# Altium schematic symbol library Capacitor - Ceramic - Sumsung.SchLib: 1421 symbols (part 7 of 8) (continued)
## CL31C101JHFNFNE (continued)
CAP CER 100PF 630V NP0 1206; Part Number: CL31C101JHFNFNE; Manufacturer: Samsung Electro-Mechanics America, Inc.; TemperatureRange: -55C ~ 125C; TemperatureCoefficient: C0G, NP0; Tolerance: 5%; Value: 100pF; PartId: 15492; Supplier 1: Digi-Key; Supplier Part Number 1: 1276-3197-2-ND; ComponentLink1Description: Datasheet; ComponentLink1URL: http://www.samsungsem.com/kr/support/product-search/mlcc/CL31C101JHFNFNE.jsp; ComponentLink2Description: Digi-Key Listing; ComponentLink2URL: https://www.digikey.com/product-detail/en/samsung-electro-mechanics-america-inc/CL31C101JHFNFNE/1276-3197-2-ND/3888855; Voltage: 630V; Price: 0.044; Device Package: 1206 (3216 Metric)
footprint CAP 1206/3216
pins: 1, 2

## CL31C101JHFNNNE
designator C?, comment 100pF
CAP CER 100PF 630V NP0 1206; Part Number: CL31C101JHFNNNE; Manufacturer: Samsung Electro-Mechanics America, Inc.; TemperatureRange: -55C ~ 125C; TemperatureCoefficient: C0G, NP0; Tolerance: 5%; Value: 100pF; PartId: 15476; Supplier 1: Digi-Key; Supplier Part Number 1: 1276-3198-2-ND; ComponentLink1Description: Datasheet; ComponentLink1URL: http://www.samsungsem.com/kr/support/product-search/mlcc/CL31C101JHFNNNE.jsp; ComponentLink2Description: Digi-Key Listing; ComponentLink2URL: https://www.digikey.com/product-detail/en/samsung-electro-mechanics-america-inc/CL31C101JHFNNNE/1276-3198-2-ND/3888856; Voltage: 630V; Price: 0.044; Device Package: 1206 (3216 Metric)
footprint CAP 1206/3216
pins: 1, 2

## CL31C101JIFNNNE
designator C?, comment 100pF
CAP CER 100PF 1KV NP0 1206; Part Number: CL31C101JIFNNNE; Manufacturer: Samsung Electro-Mechanics America, Inc.; TemperatureRange: -55C ~ 125C; TemperatureCoefficient: C0G, NP0; Tolerance: 5%; Voltage: 1000V (1kV); Value: 100pF; PartId: 15447; Supplier 1: Digi-Key; Supplier Part Number 1: 1276-3200-2-ND; ComponentLink1Description: Datasheet; ComponentLink1URL: http://www.samsungsem.com/kr/support/product-search/mlcc/CL31C101JIFNNNE.jsp; ComponentLink2Description: Digi-Key Listing; ComponentLink2URL: https://www.digikey.com/product-detail/en/samsung-electro-mechanics-america-inc/CL31C101JIFNNNE/1276-3200-2-ND/3888858; Price: 0.0547; Device Package: 1206 (3216 Metric)
footprint CAP 1206/3216
pins: 1, 2

## CL31C101JJHNNNE
designator C?, comment 100pF
CAP CER 100PF 2KV NP0 1206; Part Number: CL31C101JJHNNNE; Manufacturer: Samsung Electro-Mechanics America, Inc.; TemperatureRange: -55C ~ 125C; TemperatureCoefficient: C0G, NP0; Tolerance: 5%; Voltage: 2000V (2kV); Value: 100pF; PartId: 15471; Supplier 1: Digi-Key; Supplier Part Number 1: 1276-3201-2-ND; ComponentLink1Description: Datasheet; ComponentLink1URL: http://www.samsungsem.com/kr/support/product-search/mlcc/CL31C101JJHNNNE.jsp; ComponentLink2Description: Digi-Key Listing; ComponentLink2URL: https://www.digikey.com/product-detail/en/samsung-electro-mechanics-america-inc/CL31C101JJHNNNE/1276-3201-2-ND/3888859; Price: 0.0874; Device Package: 1206 (3216 Metric)
footprint CAP 1206/3216
pins: 1, 2

## CL31C101KBCNNNC
designator C?, comment 100pF
CAP CER 100PF 50V NP0 1206; Part Number: CL31C101KBCNNNC; Manufacturer: Samsung Electro-Mechanics America, Inc.; TemperatureRange: -55C ~ 125C; TemperatureCoefficient: C0G, NP0; Tolerance: 10%; Value: 100pF; PartId: 17304; Supplier 1: Digi-Key; Supplier Part Number 1: 1276-2802-2-ND; ComponentLink1Description: Datasheet; ComponentLink1URL: http://www.samsungsem.com/kr/support/product-search/mlcc/__icsFiles/afieldfile/2016/08/18/S_CL31C101KBCNNNC.pdf; ComponentLink2Description: Digi-Key Listing; ComponentLink2URL: https://www.digikey.com/product-detail/en/samsung-electro-mechanics-america-inc/CL31C101KBCNNNC/1276-2802-2-ND/3888460; Voltage: 50V; Price: 0.0339; Device Package: 1206 (3216 Metric)
footprint CAP 1206/3216 - 1.0MM
pins: 1, 2

## CL31C101KGFNNNE
designator C?, comment 100pF
CAP CER 100PF 500V NP0 1206; Part Number: CL31C101KGFNNNE; Manufacturer: Samsung Electro-Mechanics America, Inc.; TemperatureRange: -55C ~ 125C; TemperatureCoefficient: C0G, NP0; Tolerance: 10%; Value: 100pF; PartId: 15432; Supplier 1: Digi-Key; Supplier Part Number 1: 1276-3202-2-ND; ComponentLink1Description: Datasheet; ComponentLink1URL: http://www.samsungsem.com/kr/support/product-search/mlcc/CL31C101KGFNNNE.jsp; ComponentLink2Description: Digi-Key Listing; ComponentLink2URL: https://www.digikey.com/product-detail/en/samsung-electro-mechanics-america-inc/CL31C101KGFNNNE/1276-3202-2-ND/3888860; Voltage: 500V; Price: 0.044; Device Package: 1206 (3216 Metric)
footprint CAP 1206/3216
pins: 1, 2

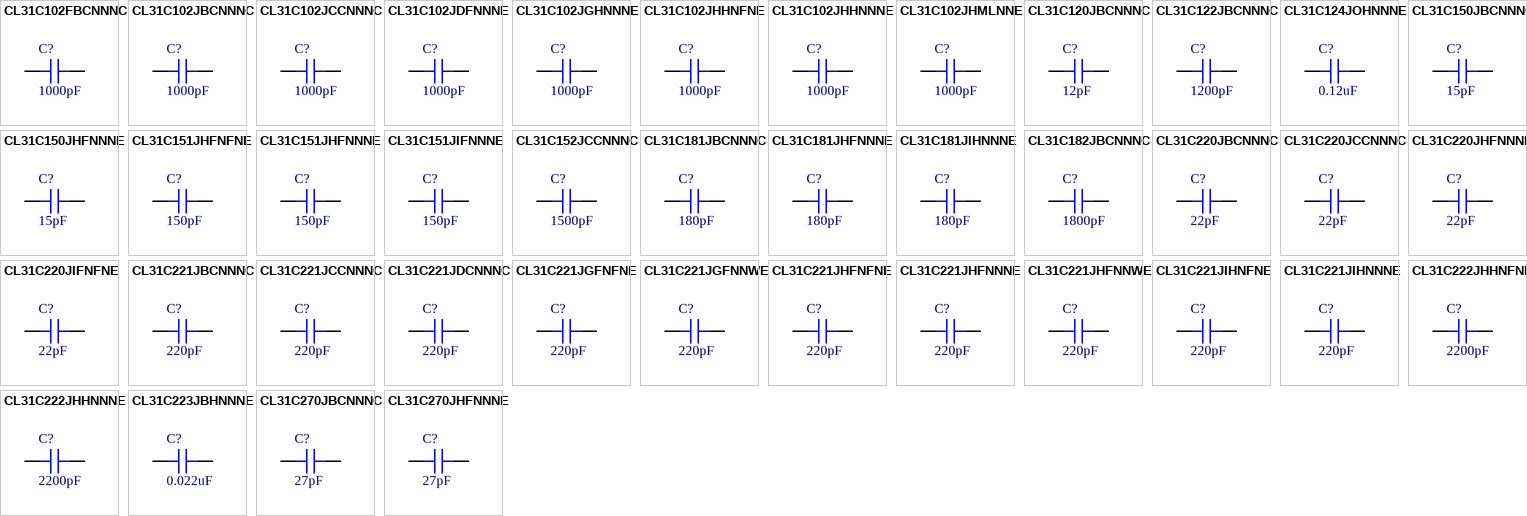
[diagram p30: symbols CL31C102FBCNNNC to CL31C270JHFNNNE]

## CL31C102FBCNNNC
designator C?, comment 1000pF
CAP CER 1000PF 50V NP0 1206; Part Number: CL31C102FBCNNNC; Manufacturer: Samsung Electro-Mechanics America, Inc.; TemperatureRange: -55C ~ 125C; TemperatureCoefficient: C0G, NP0; Tolerance: 1%; Value: 1000pF; PartId: 16975; Supplier 1: Digi-Key; Supplier Part Number 1: 1276-2803-2-ND; ComponentLink1Description: Datasheet; ComponentLink1URL: //media.digikey.com/pdf/Data%20Sheets/Samsung%20PDFs/CL31C102FBCNNNC_Spec.pdf; ComponentLink2Description: Digi-Key Listing; ComponentLink2URL: https://www.digikey.com/product-detail/en/samsung-electro-mechanics-america-inc/CL31C102FBCNNNC/1276-2803-2-ND/3888461; Voltage: 50V; Price: 0.2031; Device Package: 1206 (3216 Metric)
footprint CAP 1206/3216 - 1.0MM
pins: 1, 2

## CL31C102JBCNNNC
designator C?, comment 1000pF
CAP CER 1000PF 50V NP0 1206; Part Number: CL31C102JBCNNNC; Manufacturer: Samsung Electro-Mechanics America, Inc.; TemperatureRange: -55C ~ 125C; TemperatureCoefficient: C0G, NP0; Tolerance: 5%; Value: 1000pF; PartId: 17139; Supplier 1: Digi-Key; Supplier Part Number 1: 1276-1310-2-ND; ComponentLink1Description: Datasheet; ComponentLink1URL: http://www.samsungsem.com/kr/support/product-search/mlcc/__icsFiles/afieldfile/2016/08/18/S_CL31C102JBCNNNC.pdf; ComponentLink2Description: Digi-Key Listing; ComponentLink2URL: https://www.digikey.com/product-detail/en/samsung-electro-mechanics-america-inc/CL31C102JBCNNNC/1276-1310-2-ND/3886968; Voltage: 50V; Price: 0.0455; Device Package: 1206 (3216 Metric)
footprint CAP 1206/3216 - 1.0MM
pins: 1, 2

## CL31C102JCCNNNC
designator C?, comment 1000pF
CAP CER 1000PF 100V NP0 1206; Part Number: CL31C102JCCNNNC; Manufacturer: Samsung Electro-Mechanics America, Inc.; TemperatureRange: -55C ~ 125C; TemperatureCoefficient: C0G, NP0; Tolerance: 5%; Value: 1000pF; PartId: 17075; Supplier 1: Digi-Key; Supplier Part Number 1: 1276-2805-2-ND; ComponentLink1Description: Datasheet; ComponentLink1URL: http://www.samsungsem.com/kr/support/product-search/mlcc/__icsFiles/afieldfile/2016/08/18/S_CL31C102JCCNNNC.pdf; ComponentLink2Description: Digi-Key Listing; ComponentLink2URL: https://www.digikey.com/product-detail/en/samsung-electro-mechanics-america-inc/CL31C102JCCNNNC/1276-2805-2-ND/3888463; Voltage: 100V; Price: 0.0722; Device Package: 1206 (3216 Metric)
footprint CAP 1206/3216 - 1.0MM
pins: 1, 2

## CL31C102JDFNNNE
designator C?, comment 1000pF
CAP CER 1000PF 200V NP0 1206; Part Number: CL31C102JDFNNNE; Manufacturer: Samsung Electro-Mechanics America, Inc.; TemperatureRange: -55C ~ 125C; TemperatureCoefficient: C0G, NP0; Tolerance: 5%; Value: 1000pF; PartId: 15440; Supplier 1: Digi-Key; Supplier Part Number 1: 1276-3204-2-ND; ComponentLink1Description: Datasheet; ComponentLink1URL: http://www.samsungsem.com/kr/support/product-search/mlcc/CL31C102JDFNNNE.jsp; ComponentLink2Description: Digi-Key Listing; ComponentLink2URL: https://www.digikey.com/product-detail/en/samsung-electro-mechanics-america-inc/CL31C102JDFNNNE/1276-3204-2-ND/3888862; Voltage: 200V; Price: 0.0528; Device Package: 1206 (3216 Metric)
footprint CAP 1206/3216
pins: 1, 2

## CL31C102JGHNNNE
designator C?, comment 1000pF
CAP CER 1000PF 500V NP0 1206; Part Number: CL31C102JGHNNNE; Manufacturer: Samsung Electro-Mechanics America, Inc.; TemperatureRange: -55C ~ 125C; TemperatureCoefficient: C0G, NP0; Tolerance: 5%; Value: 1000pF; PartId: 15450; Supplier 1: Digi-Key; Supplier Part Number 1: 1276-3206-2-ND; ComponentLink1Description: Datasheet; ComponentLink1URL: http://www.samsungsem.com/kr/support/product-search/mlcc/CL31C102JGHNNNE.jsp; ComponentLink2Description: Digi-Key Listing; ComponentLink2URL: https://www.digikey.com/product-detail/en/samsung-electro-mechanics-america-inc/CL31C102JGHNNNE/1276-3206-2-ND/3888864; Voltage: 500V; Price: 0.0582; Device Package: 1206 (3216 Metric)
footprint CAP 1206/3216
pins: 1, 2

## CL31C102JHHNFNE
designator C?, comment 1000pF
CAP CER 1000PF 630V NP0 1206; Part Number: CL31C102JHHNFNE; Manufacturer: Samsung Electro-Mechanics America, Inc.; TemperatureRange: -55C ~ 125C; TemperatureCoefficient: C0G, NP0; Tolerance: 5%; Value: 1000pF; PartId: 15409; Supplier 1: Digi-Key; Supplier Part Number 1: 1276-3207-2-ND; ComponentLink1Description: Datasheet; ComponentLink1URL: http://www.samsungsem.com/kr/support/product-search/mlcc/CL31C102JHHNFNE.jsp; ComponentLink2Description: Digi-Key Listing; ComponentLink2URL: https://www.digikey.com/product-detail/en/samsung-electro-mechanics-america-inc/CL31C102JHHNFNE/1276-3207-2-ND/3888865; Voltage: 630V; Price: 0.0582; Device Package: 1206 (3216 Metric)
footprint CAP 1206/3216
pins: 1, 2

## CL31C102JHHNNNE
designator C?, comment 1000pF
CAP CER 1000PF 630V NP0 1206; Part Number: CL31C102JHHNNNE; Manufacturer: Samsung Electro-Mechanics America, Inc.; TemperatureRange: -55C ~ 125C; TemperatureCoefficient: C0G, NP0; Tolerance: 5%; Value: 1000pF; PartId: 15451; Supplier 1: Digi-Key; Supplier Part Number 1: 1276-3208-2-ND; ComponentLink1Description: Datasheet; ComponentLink1URL: http://www.samsungsem.com/kr/support/product-search/mlcc/CL31C102JHHNNNE.jsp; ComponentLink2Description: Digi-Key Listing; ComponentLink2URL: https://www.digikey.com/product-detail/en/samsung-electro-mechanics-america-inc/CL31C102JHHNNNE/1276-3208-2-ND/3888866; Voltage: 630V; Price: 0.0582; Device Package: 1206 (3216 Metric)
footprint CAP 1206/3216
pins: 1, 2

## CL31C102JHMLNNE
designator C?, comment 1000pF
CAP CER 1000PF 630V NP0 1206; Part Number: CL31C102JHMLNNE; Manufacturer: Samsung Electro-Mechanics America, Inc.; TemperatureRange: -55C ~ 125C; TemperatureCoefficient: C0G, NP0; Tolerance: 5%; Value: 1000pF; PartId: 15452; Supplier 1: Digi-Key; Supplier Part Number 1: 1276-3209-2-ND; ComponentLink1Description: Datasheet; ComponentLink1URL: http://www.samsungsem.com/kr/support/product-search/mlcc/CL31C102JHMLNNE.jsp; ComponentLink2Description: Digi-Key Listing; ComponentLink2URL: https://www.digikey.com/product-detail/en/samsung-electro-mechanics-america-inc/CL31C102JHMLNNE/1276-3209-2-ND/3888867; Voltage: 630V; Price: 0.0582; Device Package: 1206 (3216 Metric)
footprint CAP 1206/3216
pins: 1, 2

## CL31C120JBCNNNC
designator C?, comment 12pF
CAP CER 12PF 50V NP0 1206; Part Number: CL31C120JBCNNNC; Manufacturer: Samsung Electro-Mechanics America, Inc.; TemperatureRange: -55C ~ 125C; TemperatureCoefficient: C0G, NP0; Tolerance: 5%; Value: 12pF; PartId: 17168; Supplier 1: Digi-Key; Supplier Part Number 1: 1276-2806-2-ND; ComponentLink1Description: Datasheet; ComponentLink1URL: http://www.samsungsem.com/kr/support/product-search/mlcc/__icsFiles/afieldfile/2016/08/18/S_CL31C120JBCNNNC.pdf; ComponentLink2Description: Digi-Key Listing; ComponentLink2URL: https://www.digikey.com/product-detail/en/samsung-electro-mechanics-america-inc/CL31C120JBCNNNC/1276-2806-2-ND/3888464; Voltage: 50V; Price: 0.0369; Device Package: 1206 (3216 Metric)
footprint CAP 1206/3216 - 1.0MM
pins: 1, 2

## CL31C122JBCNNNC
designator C?, comment 1200pF
CAP CER 1200PF 50V NP0 1206; Part Number: CL31C122JBCNNNC; Manufacturer: Samsung Electro-Mechanics America, Inc.; TemperatureRange: -55C ~ 125C; TemperatureCoefficient: C0G, NP0; Tolerance: 5%; Value: 1200pF; PartId: 17129; Supplier 1: Digi-Key; Supplier Part Number 1: 1276-2808-2-ND; ComponentLink1Description: Datasheet; ComponentLink1URL: http://www.samsungsem.com/kr/support/product-search/mlcc/__icsFiles/afieldfile/2016/08/18/S_CL31C122JBCNNNC.pdf; ComponentLink2Description: Digi-Key Listing; ComponentLink2URL: https://www.digikey.com/product-detail/en/samsung-electro-mechanics-america-inc/CL31C122JBCNNNC/1276-2808-2-ND/3888466; Voltage: 50V; Price: 0.0739; Device Package: 1206 (3216 Metric)
footprint CAP 1206/3216 - 1.0MM
pins: 1, 2

## CL31C124JOHNNNE
designator C?, comment 0.12uF
CAP CER 0.12UF 16V NP0 1206; Part Number: CL31C124JOHNNNE; Manufacturer: Samsung Electro-Mechanics America, Inc.; TemperatureRange: -55C ~ 125C; TemperatureCoefficient: C0G, NP0; Tolerance: 5%; Value: 0.12uF; PartId: 17486; Supplier 1: Digi-Key; Supplier Part Number 1: 1276-3213-2-ND; ComponentLink1Description: Datasheet; ComponentLink1URL: http://www.samsungsem.com/kr/support/product-search/mlcc/__icsFiles/afieldfile/2016/08/18/S_CL31C124JOHNNNE.pdf; ComponentLink2Description: Digi-Key Listing; ComponentLink2URL: https://www.digikey.com/product-detail/en/samsung-electro-mechanics-america-inc/CL31C124JOHNNNE/1276-3213-2-ND/3888871; Voltage: 16V; Price: 0.241; Device Package: 1206 (3216 Metric)
footprint CAP 1206/3216 - 1.8MM
pins: 1, 2

## CL31C150JBCNNNC
designator C?, comment 15pF
CAP CER 15PF 50V NP0 1206; Part Number: CL31C150JBCNNNC; Manufacturer: Samsung Electro-Mechanics America, Inc.; TemperatureRange: -55C ~ 125C; TemperatureCoefficient: C0G, NP0; Tolerance: 5%; Value: 15pF; PartId: 17289; Supplier 1: Digi-Key; Supplier Part Number 1: 1276-2809-2-ND; ComponentLink1Description: Datasheet; ComponentLink1URL: http://www.samsungsem.com/kr/support/product-search/mlcc/__icsFiles/afieldfile/2016/08/18/S_CL31C150JBCNNNC.pdf; ComponentLink2Description: Digi-Key Listing; ComponentLink2URL: https://www.digikey.com/product-detail/en/samsung-electro-mechanics-america-inc/CL31C150JBCNNNC/1276-2809-2-ND/3888467; Voltage: 50V; Price: 0.0361; Device Package: 1206 (3216 Metric)
footprint CAP 1206/3216 - 1.0MM
pins: 1, 2

## CL31C150JHFNNNE
designator C?, comment 15pF
CAP CER 15PF 630V NP0 1206; Part Number: CL31C150JHFNNNE; Manufacturer: Samsung Electro-Mechanics America, Inc.; TemperatureRange: -55C ~ 125C; TemperatureCoefficient: C0G, NP0; Tolerance: 5%; Value: 15pF; PartId: 15402; Supplier 1: Digi-Key; Supplier Part Number 1: 1276-3215-2-ND; ComponentLink1Description: Datasheet; ComponentLink1URL: http://www.samsungsem.com/kr/support/product-search/mlcc/CL31C150JHFNNNE.jsp; ComponentLink2Description: Digi-Key Listing; ComponentLink2URL: https://www.digikey.com/product-detail/en/samsung-electro-mechanics-america-inc/CL31C150JHFNNNE/1276-3215-2-ND/3888873; Voltage: 630V; Price: 0.029; Device Package: 1206 (3216 Metric)
footprint CAP 1206/3216
pins: 1, 2

## CL31C151JHFNFNE
designator C?, comment 150pF
CAP CER 150PF 630V NP0 1206; Part Number: CL31C151JHFNFNE; Manufacturer: Samsung Electro-Mechanics America, Inc.; TemperatureRange: -55C ~ 125C; TemperatureCoefficient: C0G, NP0; Tolerance: 5%; Value: 150pF; PartId: 15493; Supplier 1: Digi-Key; Supplier Part Number 1: 1276-3217-2-ND; ComponentLink1Description: Datasheet; ComponentLink1URL: http://www.samsungsem.com/kr/support/product-search/mlcc/CL31C151JHFNFNE.jsp; ComponentLink2Description: Digi-Key Listing; ComponentLink2URL: https://www.digikey.com/product-detail/en/samsung-electro-mechanics-america-inc/CL31C151JHFNFNE/1276-3217-2-ND/3888875; Voltage: 630V; Price: 0.044; Device Package: 1206 (3216 Metric)
footprint CAP 1206/3216
pins: 1, 2

## CL31C151JHFNNNE
designator C?, comment 150pF
CAP CER 150PF 630V NP0 1206; Part Number: CL31C151JHFNNNE; Manufacturer: Samsung Electro-Mechanics America, Inc.; TemperatureRange: -55C ~ 125C; TemperatureCoefficient: C0G, NP0; Tolerance: 5%; Value: 150pF; PartId: 15477; Supplier 1: Digi-Key; Supplier Part Number 1: 1276-3218-2-ND; ComponentLink1Description: Datasheet; ComponentLink1URL: http://www.samsungsem.com/kr/support/product-search/mlcc/CL31C151JHFNNNE.jsp; ComponentLink2Description: Digi-Key Listing; ComponentLink2URL: https://www.digikey.com/product-detail/en/samsung-electro-mechanics-america-inc/CL31C151JHFNNNE/1276-3218-2-ND/3888876; Voltage: 630V; Price: 0.044; Device Package: 1206 (3216 Metric)
footprint CAP 1206/3216
pins: 1, 2

## CL31C151JIFNNNE
designator C?, comment 150pF
CAP CER 150PF 1KV NP0 1206; Part Number: CL31C151JIFNNNE; Manufacturer: Samsung Electro-Mechanics America, Inc.; TemperatureRange: -55C ~ 125C; TemperatureCoefficient: C0G, NP0; Tolerance: 5%; Voltage: 1000V (1kV); Value: 150pF; PartId: 15410; Supplier 1: Digi-Key; Supplier Part Number 1: 1276-3219-2-ND; ComponentLink1Description: Datasheet; ComponentLink1URL: http://www.samsungsem.com/kr/support/product-search/mlcc/CL31C151JIFNNNE.jsp; ComponentLink2Description: Digi-Key Listing; ComponentLink2URL: https://www.digikey.com/product-detail/en/samsung-electro-mechanics-america-inc/CL31C151JIFNNNE/1276-3219-2-ND/3888877; Price: 0.0593; Device Package: 1206 (3216 Metric)
footprint CAP 1206/3216
pins: 1, 2

## CL31C152JCCNNNC
designator C?, comment 1500pF
CAP CER 1500PF 100V NP0 1206; Part Number: CL31C152JCCNNNC; Manufacturer: Samsung Electro-Mechanics America, Inc.; TemperatureRange: -55C ~ 125C; TemperatureCoefficient: C0G, NP0; Tolerance: 5%; Value: 1500pF; PartId: 17132; Supplier 1: Digi-Key; Supplier Part Number 1: 1276-2814-2-ND; ComponentLink1Description: Datasheet; ComponentLink1URL: http://www.samsungsem.com/kr/support/product-search/mlcc/__icsFiles/afieldfile/2016/08/18/S_CL31C152JCCNNNC.pdf; ComponentLink2Description: Digi-Key Listing; ComponentLink2URL: https://www.digikey.com/product-detail/en/samsung-electro-mechanics-america-inc/CL31C152JCCNNNC/1276-2814-2-ND/3888472; Voltage: 100V; Price: 0.0705; Device Package: 1206 (3216 Metric)
footprint CAP 1206/3216 - 1.0MM
pins: 1, 2

## CL31C181JBCNNNC
designator C?, comment 180pF
CAP CER 180PF 50V NP0 1206; Part Number: CL31C181JBCNNNC; Manufacturer: Samsung Electro-Mechanics America, Inc.; TemperatureRange: -55C ~ 125C; TemperatureCoefficient: C0G, NP0; Tolerance: 5%; Value: 180pF; PartId: 17284; Supplier 1: Digi-Key; Supplier Part Number 1: 1276-2815-2-ND; ComponentLink1Description: Datasheet; ComponentLink1URL: http://www.samsungsem.com/kr/support/product-search/mlcc/__icsFiles/afieldfile/2016/08/18/S_CL31C181JBCNNNC.pdf; ComponentLink2Description: Digi-Key Listing; ComponentLink2URL: https://www.digikey.com/product-detail/en/samsung-electro-mechanics-america-inc/CL31C181JBCNNNC/1276-2815-2-ND/3888473; Voltage: 50V; Price: 0.0399; Device Package: 1206 (3216 Metric)
footprint CAP 1206/3216 - 1.0MM
pins: 1, 2

## CL31C181JHFNNNE
designator C?, comment 180pF
CAP CER 180PF 630V NP0 1206; Part Number: CL31C181JHFNNNE; Manufacturer: Samsung Electro-Mechanics America, Inc.; TemperatureRange: -55C ~ 125C; TemperatureCoefficient: C0G, NP0; Tolerance: 5%; Value: 180pF; PartId: 15495; Supplier 1: Digi-Key; Supplier Part Number 1: 1276-3223-2-ND; ComponentLink1Description: Datasheet; ComponentLink1URL: http://www.samsungsem.com/kr/support/product-search/mlcc/CL31C181JHFNNNE.jsp; ComponentLink2Description: Digi-Key Listing; ComponentLink2URL: https://www.digikey.com/product-detail/en/samsung-electro-mechanics-america-inc/CL31C181JHFNNNE/1276-3223-2-ND/3888881; Voltage: 630V; Price: 0.06; Device Package: 1206 (3216 Metric)
footprint CAP 1206/3216
pins: 1, 2

## CL31C181JIHNNNE
designator C?, comment 180pF
CAP CER 180PF 1KV NP0 1206; Part Number: CL31C181JIHNNNE; Manufacturer: Samsung Electro-Mechanics America, Inc.; TemperatureRange: -55C ~ 125C; TemperatureCoefficient: C0G, NP0; Tolerance: 5%; Voltage: 1000V (1kV); Value: 180pF; PartId: 15456; Supplier 1: Digi-Key; Supplier Part Number 1: 1276-3224-2-ND; ComponentLink1Description: Datasheet; ComponentLink1URL: http://www.samsungsem.com/kr/support/product-search/mlcc/CL31C181JIHNNNE.jsp; ComponentLink2Description: Digi-Key Listing; ComponentLink2URL: https://www.digikey.com/product-detail/en/samsung-electro-mechanics-america-inc/CL31C181JIHNNNE/1276-3224-2-ND/3888882; Price: 0.0593; Device Package: 1206 (3216 Metric)
footprint CAP 1206/3216
pins: 1, 2

## CL31C182JBCNNNC
designator C?, comment 1800pF
CAP CER 1800PF 50V NP0 1206; Part Number: CL31C182JBCNNNC; Manufacturer: Samsung Electro-Mechanics America, Inc.; TemperatureRange: -55C ~ 125C; TemperatureCoefficient: C0G, NP0; Tolerance: 5%; Value: 1800pF; PartId: 17208; Supplier 1: Digi-Key; Supplier Part Number 1: 1276-2816-2-ND; ComponentLink1Description: Datasheet; ComponentLink1URL: http://www.samsungsem.com/kr/support/product-search/mlcc/__icsFiles/afieldfile/2016/08/18/S_CL31C182JBCNNNC.pdf; ComponentLink2Description: Digi-Key Listing; ComponentLink2URL: https://www.digikey.com/product-detail/en/samsung-electro-mechanics-america-inc/CL31C182JBCNNNC/1276-2816-2-ND/3888474; Voltage: 50V; Price: 0.0894; Device Package: 1206 (3216 Metric)
footprint CAP 1206/3216 - 1.0MM
pins: 1, 2

## CL31C220JBCNNNC
designator C?, comment 22pF
CAP CER 22PF 50V NP0 1206; Part Number: CL31C220JBCNNNC; Manufacturer: Samsung Electro-Mechanics America, Inc.; TemperatureRange: -55C ~ 125C; TemperatureCoefficient: C0G, NP0; Tolerance: 5%; Value: 22pF; PartId: 17142; Supplier 1: Digi-Key; Supplier Part Number 1: 1276-1203-2-ND; ComponentLink1Description: Datasheet; ComponentLink1URL: http://www.samsungsem.com/kr/support/product-search/mlcc/__icsFiles/afieldfile/2016/08/18/S_CL31C220JBCNNNC.pdf; ComponentLink2Description: Digi-Key Listing; ComponentLink2URL: https://www.digikey.com/product-detail/en/samsung-electro-mechanics-america-inc/CL31C220JBCNNNC/1276-1203-2-ND/3886861; Voltage: 50V; Price: 0.0361; Device Package: 1206 (3216 Metric)
footprint CAP 1206/3216 - 1.0MM
pins: 1, 2

## CL31C220JCCNNNC
designator C?, comment 22pF
CAP CER 22PF 100V NP0 1206; Part Number: CL31C220JCCNNNC; Manufacturer: Samsung Electro-Mechanics America, Inc.; TemperatureRange: -55C ~ 125C; TemperatureCoefficient: C0G, NP0; Tolerance: 5%; Value: 22pF; PartId: 17299; Supplier 1: Digi-Key; Supplier Part Number 1: 1276-2820-2-ND; ComponentLink1Description: Datasheet; ComponentLink1URL: http://www.samsungsem.com/kr/support/product-search/mlcc/__icsFiles/afieldfile/2016/08/18/S_CL31C220JCCNNNC.pdf; ComponentLink2Description: Digi-Key Listing; ComponentLink2URL: https://www.digikey.com/product-detail/en/samsung-electro-mechanics-america-inc/CL31C220JCCNNNC/1276-2820-2-ND/3888478; Voltage: 100V; Price: 0.045; Device Package: 1206 (3216 Metric)
footprint CAP 1206/3216 - 1.0MM
pins: 1, 2

## CL31C220JHFNNNE
designator C?, comment 22pF
CAP CER 22PF 630V NP0 1206; Part Number: CL31C220JHFNNNE; Manufacturer: Samsung Electro-Mechanics America, Inc.; TemperatureRange: -55C ~ 125C; TemperatureCoefficient: C0G, NP0; Tolerance: 5%; Value: 22pF; PartId: 15420; Supplier 1: Digi-Key; Supplier Part Number 1: 1276-3226-2-ND; ComponentLink1Description: Datasheet; ComponentLink1URL: http://www.samsungsem.com/kr/support/product-search/mlcc/CL31C220JHFNNNE.jsp; ComponentLink2Description: Digi-Key Listing; ComponentLink2URL: https://www.digikey.com/product-detail/en/samsung-electro-mechanics-america-inc/CL31C220JHFNNNE/1276-3226-2-ND/3888884; Voltage: 630V; Price: 0.0779; Device Package: 1206 (3216 Metric)
footprint CAP 1206/3216
pins: 1, 2

## CL31C220JIFNFNE
designator C?, comment 22pF
CAP CER 22PF 1KV NP0 1206; Part Number: CL31C220JIFNFNE; Manufacturer: Samsung Electro-Mechanics America, Inc.; TemperatureRange: -55C ~ 125C; TemperatureCoefficient: C0G, NP0; Tolerance: 5%; Voltage: 1000V (1kV); Value: 22pF; PartId: 15474; Supplier 1: Digi-Key; Supplier Part Number 1: 1276-3227-2-ND; ComponentLink1Description: Datasheet; ComponentLink1URL: http://www.samsungsem.com/kr/support/product-search/mlcc/CL31C220JIFNFNE.jsp; ComponentLink2Description: Digi-Key Listing; ComponentLink2URL: https://www.digikey.com/product-detail/en/samsung-electro-mechanics-america-inc/CL31C220JIFNFNE/1276-3227-2-ND/3888885; Price: 0.0901; Device Package: 1206 (3216 Metric)
footprint CAP 1206/3216
pins: 1, 2

## CL31C221JBCNNNC
designator C?, comment 220pF
CAP CER 220PF 50V NP0 1206; Part Number: CL31C221JBCNNNC; Manufacturer: Samsung Electro-Mechanics America, Inc.; TemperatureRange: -55C ~ 125C; TemperatureCoefficient: C0G, NP0; Tolerance: 5%; Value: 220pF; PartId: 17163; Supplier 1: Digi-Key; Supplier Part Number 1: 1276-1166-2-ND; ComponentLink1Description: Datasheet; ComponentLink1URL: http://www.samsungsem.com/kr/support/product-search/mlcc/__icsFiles/afieldfile/2016/08/18/S_CL31C221JBCNNNC.pdf; ComponentLink2Description: Digi-Key Listing; ComponentLink2URL: https://www.digikey.com/product-detail/en/samsung-electro-mechanics-america-inc/CL31C221JBCNNNC/1276-1166-2-ND/3886824; Voltage: 50V; Price: 0.0409; Device Package: 1206 (3216 Metric)
footprint CAP 1206/3216 - 1.0MM
pins: 1, 2

## CL31C221JCCNNNC
designator C?, comment 220pF
CAP CER 220PF 100V NP0 1206; Part Number: CL31C221JCCNNNC; Manufacturer: Samsung Electro-Mechanics America, Inc.; TemperatureRange: -55C ~ 125C; TemperatureCoefficient: C0G, NP0; Tolerance: 5%; Value: 220pF; PartId: 17133; Supplier 1: Digi-Key; Supplier Part Number 1: 1276-2821-2-ND; ComponentLink1Description: Datasheet; ComponentLink1URL: http://www.samsungsem.com/kr/support/product-search/mlcc/__icsFiles/afieldfile/2016/08/18/S_CL31C221JCCNNNC.pdf; ComponentLink2Description: Digi-Key Listing; ComponentLink2URL: https://www.digikey.com/product-detail/en/samsung-electro-mechanics-america-inc/CL31C221JCCNNNC/1276-2821-2-ND/3888479; Voltage: 100V; Price: 0.0601; Device Package: 1206 (3216 Metric)
footprint CAP 1206/3216 - 1.0MM
pins: 1, 2

## CL31C221JDCNNNC
designator C?, comment 220pF
CAP CER 220PF 200V NP0 1206; Part Number: CL31C221JDCNNNC; Manufacturer: Samsung Electro-Mechanics America, Inc.; TemperatureRange: -55C ~ 125C; TemperatureCoefficient: C0G, NP0; Tolerance: 5%; Value: 220pF; PartId: 15429; Supplier 1: Digi-Key; Supplier Part Number 1: 1276-2822-2-ND; ComponentLink1Description: Datasheet; ComponentLink1URL: http://www.samsungsem.com/kr/support/product-search/mlcc/CL31C221JDCNNNC.jsp; ComponentLink2Description: Digi-Key Listing; ComponentLink2URL: https://www.digikey.com/product-detail/en/samsung-electro-mechanics-america-inc/CL31C221JDCNNNC/1276-2822-2-ND/3888480; Voltage: 200V; Price: 0.04; Device Package: 1206 (3216 Metric)
footprint CAP 1206/3216
pins: 1, 2

## CL31C221JGFNFNE
designator C?, comment 220pF
CAP CER 220PF 500V NP0 1206; Part Number: CL31C221JGFNFNE; Manufacturer: Samsung Electro-Mechanics America, Inc.; TemperatureRange: -55C ~ 125C; TemperatureCoefficient: C0G, NP0; Tolerance: 5%; Value: 220pF; PartId: 15494; Supplier 1: Digi-Key; Supplier Part Number 1: 1276-3228-2-ND; ComponentLink1Description: Datasheet; ComponentLink1URL: http://www.samsungsem.com/kr/support/product-search/mlcc/CL31C221JGFNFNE.jsp; ComponentLink2Description: Digi-Key Listing; ComponentLink2URL: https://www.digikey.com/product-detail/en/samsung-electro-mechanics-america-inc/CL31C221JGFNFNE/1276-3228-2-ND/3888886; Voltage: 500V; Price: 0.044; Device Package: 1206 (3216 Metric)
footprint CAP 1206/3216
pins: 1, 2

## CL31C221JGFNNWE
designator C?, comment 220pF
CAP CER 220PF 500V NP0 1206; Part Number: CL31C221JGFNNWE; Manufacturer: Samsung Electro-Mechanics America, Inc.; TemperatureRange: -55C ~ 125C; TemperatureCoefficient: C0G, NP0; Tolerance: 5%; Value: 220pF; PartId: 15491; Supplier 1: Digi-Key; Supplier Part Number 1: 1276-3230-2-ND; ComponentLink1Description: Datasheet; ComponentLink1URL: http://www.samsungsem.com/kr/support/product-search/mlcc/CL31C221JGFNNWE.jsp; ComponentLink2Description: Digi-Key Listing; ComponentLink2URL: https://www.digikey.com/product-detail/en/samsung-electro-mechanics-america-inc/CL31C221JGFNNWE/1276-3230-2-ND/3888888; Voltage: 500V; Price: 0.044; Device Package: 1206 (3216 Metric)
footprint CAP 1206/3216
pins: 1, 2

## CL31C221JHFNFNE
designator C?, comment 220pF
CAP CER 220PF 630V NP0 1206; Part Number: CL31C221JHFNFNE; Manufacturer: Samsung Electro-Mechanics America, Inc.; TemperatureRange: -55C ~ 125C; TemperatureCoefficient: C0G, NP0; Tolerance: 5%; Value: 220pF; PartId: 15478; Supplier 1: Digi-Key; Supplier Part Number 1: 1276-3231-2-ND; ComponentLink1Description: Datasheet; ComponentLink1URL: http://www.samsungsem.com/kr/support/product-search/mlcc/CL31C221JHFNFNE.jsp; ComponentLink2Description: Digi-Key Listing; ComponentLink2URL: https://www.digikey.com/product-detail/en/samsung-electro-mechanics-america-inc/CL31C221JHFNFNE/1276-3231-2-ND/3888889; Voltage: 630V; Price: 0.0453; Device Package: 1206 (3216 Metric)
footprint CAP 1206/3216
pins: 1, 2

## CL31C221JHFNNNE
designator C?, comment 220pF
CAP CER 220PF 630V NP0 1206; Part Number: CL31C221JHFNNNE; Manufacturer: Samsung Electro-Mechanics America, Inc.; TemperatureRange: -55C ~ 125C; TemperatureCoefficient: C0G, NP0; Tolerance: 5%; Value: 220pF; PartId: 15433; Supplier 1: Digi-Key; Supplier Part Number 1: 1276-3232-2-ND; ComponentLink1Description: Datasheet; ComponentLink1URL: http://www.samsungsem.com/kr/support/product-search/mlcc/CL31C221JHFNNNE.jsp; ComponentLink2Description: Digi-Key Listing; ComponentLink2URL: https://www.digikey.com/product-detail/en/samsung-electro-mechanics-america-inc/CL31C221JHFNNNE/1276-3232-2-ND/3888890; Voltage: 630V; Price: 0.044; Device Package: 1206 (3216 Metric)
footprint CAP 1206/3216
pins: 1, 2

## CL31C221JHFNNWE
designator C?, comment 220pF
CAP CER 220PF 630V NP0 1206; Part Number: CL31C221JHFNNWE; Manufacturer: Samsung Electro-Mechanics America, Inc.; TemperatureRange: -55C ~ 125C; TemperatureCoefficient: C0G, NP0; Tolerance: 5%; Value: 220pF; PartId: 15436; Supplier 1: Digi-Key; Supplier Part Number 1: 1276-3233-2-ND; ComponentLink1Description: Datasheet; ComponentLink1URL: http://www.samsungsem.com/kr/support/product-search/mlcc/CL31C221JHFNNWE.jsp; ComponentLink2Description: Digi-Key Listing; ComponentLink2URL: https://www.digikey.com/product-detail/en/samsung-electro-mechanics-america-inc/CL31C221JHFNNWE/1276-3233-2-ND/3888891; Voltage: 630V; Price: 0.0453; Device Package: 1206 (3216 Metric)
footprint CAP 1206/3216
pins: 1, 2

## CL31C221JIHNFNE
designator C?, comment 220pF
CAP CER 220PF 1KV NP0 1206; Part Number: CL31C221JIHNFNE; Manufacturer: Samsung Electro-Mechanics America, Inc.; TemperatureRange: -55C ~ 125C; TemperatureCoefficient: C0G, NP0; Tolerance: 5%; Voltage: 1000V (1kV); Value: 220pF; PartId: 15424; Supplier 1: Digi-Key; Supplier Part Number 1: 1276-3234-2-ND; ComponentLink1Description: Datasheet; ComponentLink1URL: http://www.samsungsem.com/kr/support/product-search/mlcc/CL31C221JIHNFNE.jsp; ComponentLink2Description: Digi-Key Listing; ComponentLink2URL: https://www.digikey.com/product-detail/en/samsung-electro-mechanics-america-inc/CL31C221JIHNFNE/1276-3234-2-ND/3888892; Price: 0.0792; Device Package: 1206 (3216 Metric)
footprint CAP 1206/3216
pins: 1, 2

## CL31C221JIHNNNE
designator C?, comment 220pF
CAP CER 220PF 1KV NP0 1206; Part Number: CL31C221JIHNNNE; Manufacturer: Samsung Electro-Mechanics America, Inc.; TemperatureRange: -55C ~ 125C; TemperatureCoefficient: C0G, NP0; Tolerance: 5%; Voltage: 1000V (1kV); Value: 220pF; PartId: 15470; Supplier 1: Digi-Key; Supplier Part Number 1: 1276-3235-2-ND; ComponentLink1Description: Datasheet; ComponentLink1URL: http://www.samsungsem.com/kr/support/product-search/mlcc/CL31C221JIHNNNE.jsp; ComponentLink2Description: Digi-Key Listing; ComponentLink2URL: https://www.digikey.com/product-detail/en/samsung-electro-mechanics-america-inc/CL31C221JIHNNNE/1276-3235-2-ND/3888893; Price: 0.0792; Device Package: 1206 (3216 Metric)
footprint CAP 1206/3216
pins: 1, 2

## CL31C222JHHNFNE
designator C?, comment 2200pF
CAP CER 2200PF 630V NP0 1206; Part Number: CL31C222JHHNFNE; Manufacturer: Samsung Electro-Mechanics America, Inc.; TemperatureRange: -55C ~ 125C; TemperatureCoefficient: C0G, NP0; Tolerance: 5%; Value: 2200pF; PartId: 15448; Supplier 1: Digi-Key; Supplier Part Number 1: 1276-3238-2-ND; ComponentLink1Description: Datasheet; ComponentLink1URL: http://www.samsungsem.com/kr/support/product-search/mlcc/CL31C222JHHNFNE.jsp; ComponentLink2Description: Digi-Key Listing; ComponentLink2URL: https://www.digikey.com/product-detail/en/samsung-electro-mechanics-america-inc/CL31C222JHHNFNE/1276-3238-2-ND/3888896; Voltage: 630V; Price: 0.0568; Device Package: 1206 (3216 Metric)
footprint CAP 1206/3216
pins: 1, 2

## CL31C222JHHNNNE
designator C?, comment 2200pF
CAP CER 2200PF 630V NP0 1206; Part Number: CL31C222JHHNNNE; Manufacturer: Samsung Electro-Mechanics America, Inc.; TemperatureRange: -55C ~ 125C; TemperatureCoefficient: C0G, NP0; Tolerance: 5%; Value: 2200pF; PartId: 15423; Supplier 1: Digi-Key; Supplier Part Number 1: 1276-3239-2-ND; ComponentLink1Description: Datasheet; ComponentLink1URL: http://www.samsungsem.com/kr/support/product-search/mlcc/CL31C222JHHNNNE.jsp; ComponentLink2Description: Digi-Key Listing; ComponentLink2URL: https://www.digikey.com/product-detail/en/samsung-electro-mechanics-america-inc/CL31C222JHHNNNE/1276-3239-2-ND/3888897; Voltage: 630V; Price: 0.0786; Device Package: 1206 (3216 Metric)
footprint CAP 1206/3216
pins: 1, 2

## CL31C223JBHNNNE
designator C?, comment 0.022uF
CAP CER 0.022UF 50V NP0 1206; Part Number: CL31C223JBHNNNE; Manufacturer: Samsung Electro-Mechanics America, Inc.; TemperatureRange: -55C ~ 125C; TemperatureCoefficient: C0G, NP0; Tolerance: 5%; Value: 0.022uF; PartId: 17940; Supplier 1: Digi-Key; Supplier Part Number 1: 1276-3240-2-ND; ComponentLink1Description: Datasheet; ComponentLink1URL: http://www.samsungsem.com/kr/support/product-search/mlcc/__icsFiles/afieldfile/2016/08/18/S_CL31C223JBHNNNE.pdf; ComponentLink2Description: Digi-Key Listing; ComponentLink2URL: https://www.digikey.com/product-detail/en/samsung-electro-mechanics-america-inc/CL31C223JBHNNNE/1276-3240-2-ND/3888898; Voltage: 50V; Price: 0.1527; Device Package: 1206 (3216 Metric)
footprint CAP 1206/3216 - 1.8MM
pins: 1, 2

## CL31C270JBCNNNC
designator C?, comment 27pF
CAP CER 27PF 50V NP0 1206; Part Number: CL31C270JBCNNNC; Manufacturer: Samsung Electro-Mechanics America, Inc.; TemperatureRange: -55C ~ 125C; TemperatureCoefficient: C0G, NP0; Tolerance: 5%; Value: 27pF; PartId: 17288; Supplier 1: Digi-Key; Supplier Part Number 1: 1276-2826-2-ND; ComponentLink1Description: Datasheet; ComponentLink1URL: http://www.samsungsem.com/kr/support/product-search/mlcc/__icsFiles/afieldfile/2016/08/18/S_CL31C270JBCNNNC.pdf; ComponentLink2Description: Digi-Key Listing; ComponentLink2URL: https://www.digikey.com/product-detail/en/samsung-electro-mechanics-america-inc/CL31C270JBCNNNC/1276-2826-2-ND/3888484; Voltage: 50V; Price: 0.0361; Device Package: 1206 (3216 Metric)
footprint CAP 1206/3216 - 1.0MM
pins: 1, 2

## CL31C270JHFNNNE
designator C?, comment 27pF
CAP CER 27PF 630V NP0 1206; Part Number: CL31C270JHFNNNE; Manufacturer: Samsung Electro-Mechanics America, Inc.; TemperatureRange: -55C ~ 125C; TemperatureCoefficient: C0G, NP0; Tolerance: 5%; Value: 27pF; PartId: 15425; Supplier 1: Digi-Key; Supplier Part Number 1: 1276-3241-2-ND; ComponentLink1Description: Datasheet; ComponentLink1URL: http://www.samsungsem.com/kr/support/product-search/mlcc/CL31C270JHFNNNE.jsp; ComponentLink2Description: Digi-Key Listing; ComponentLink2URL: https://www.digikey.com/product-detail/en/samsung-electro-mechanics-america-inc/CL31C270JHFNNNE/1276-3241-2-ND/3888899; Voltage: 630V; Price: 0.0855; Device Package: 1206 (3216 Metric)
footprint CAP 1206/3216
pins: 1, 2
